# Altium footprint library 3.22-杂项.PcbLib: 985 footprints (part 52 of 64)
Each footprint in its own frame and in the unit in brackets; x right, y up, seen from the top. Pads: shape width x height; smd on the part's side, far side on the other; paste and mask are expansions set on the pad; w line width, h text height; cw(c..) or ccw(c..) is an arc to the next point about the centre after c.
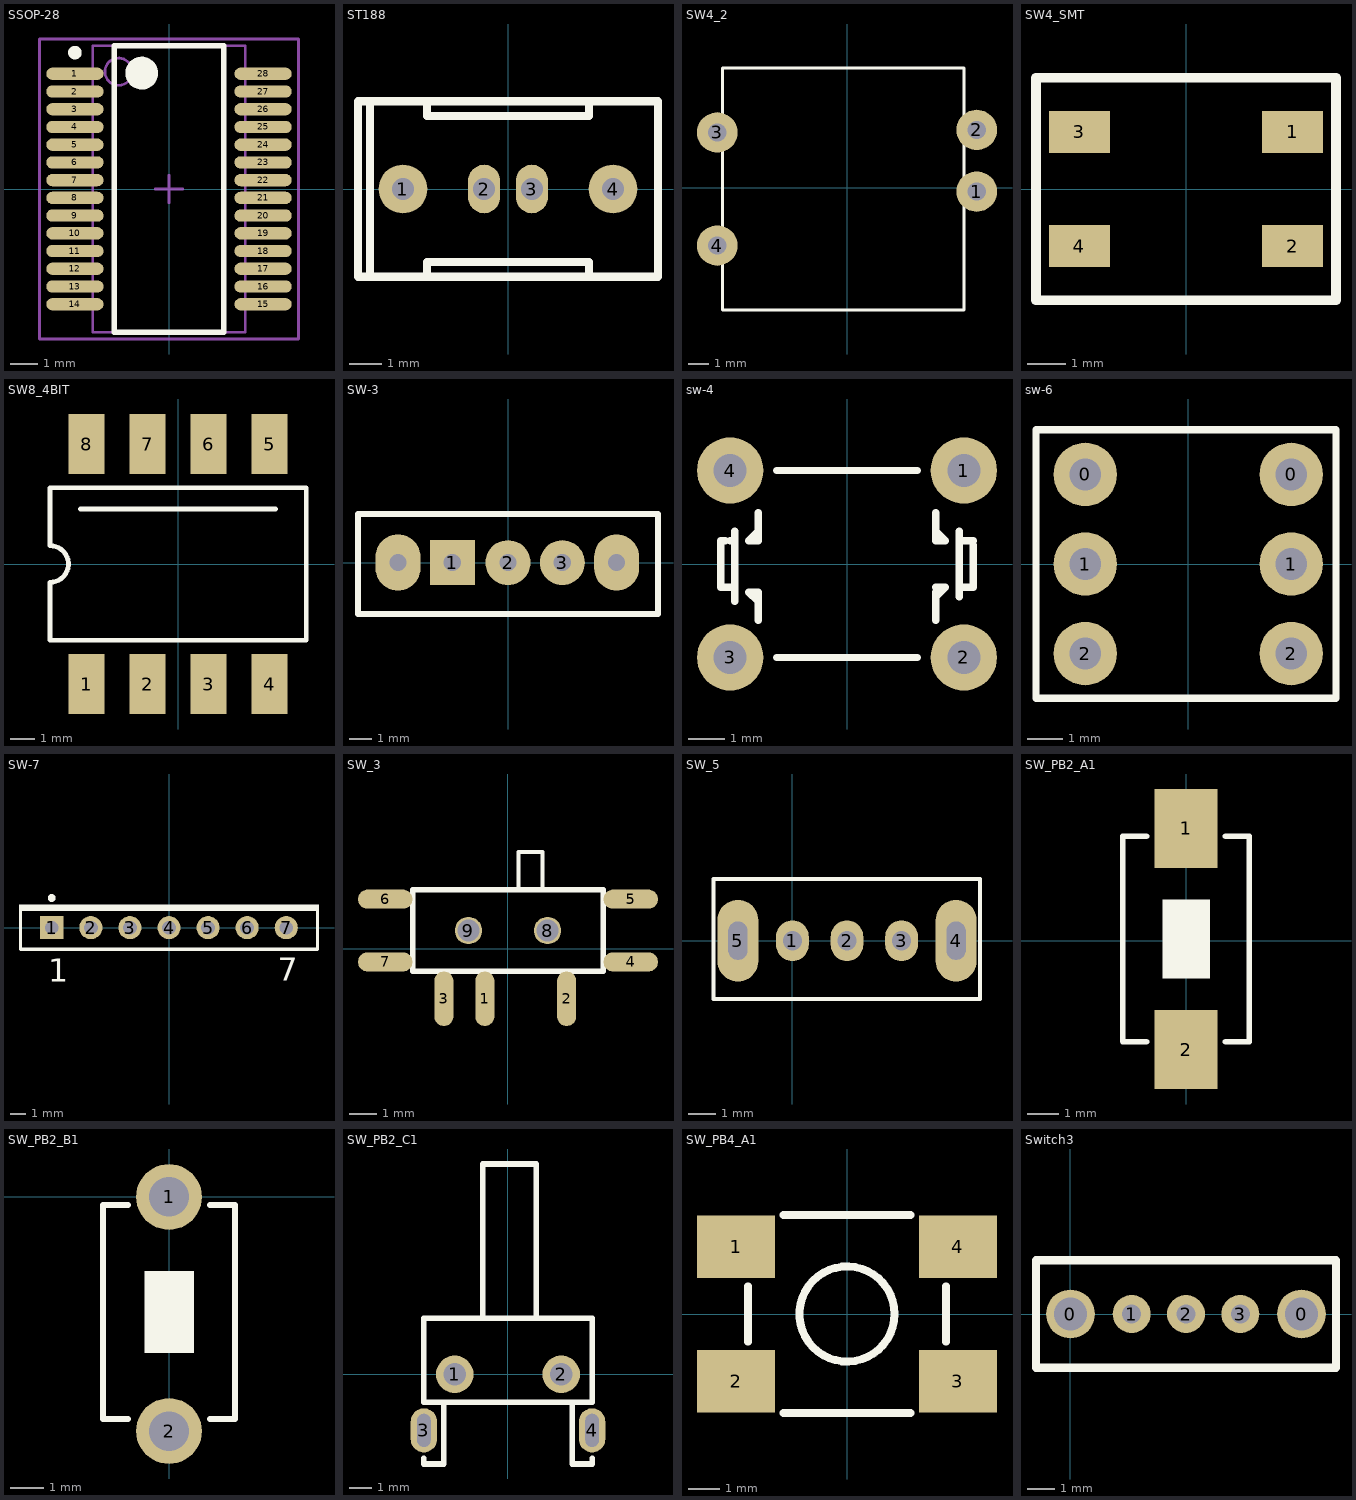
[diagram p51: the footprints below, top view; thin cyan lines are the x and y axes]

## SSOP-28 [mm] "FT232"
height 2
pads (28):
  oval 2.1x0.45 smd: 1(-3.45,4.225) 2(-3.45,3.575) 3(-3.45,2.925) 4(-3.45,2.275) 5(-3.45,1.625) 6(-3.45,0.975) 7(-3.45,0.325) 8(-3.45,-0.325) 9(-3.45,-0.975) 10(-3.45,-1.625) 11(-3.45,-2.275) 12(-3.45,-2.925) 13(-3.45,-3.575) 14(-3.45,-4.225) 15(3.45,-4.225) 16(3.45,-3.575) 17(3.45,-2.925) 18(3.45,-2.275) 19(3.45,-1.625) 20(3.45,-0.975) 21(3.45,-0.325) 22(3.45,0.325) 23(3.45,0.975) 24(3.45,1.625) 25(3.45,2.275) 26(3.45,2.925) 27(3.45,3.575) 28(3.45,4.225)
Top Overlay:
  circle w0.25: c-3.45,5 r0.125
  circle w0.6: c-1,4.25 r0.3
  lines w0.2: -2,-5.25 -2,5.25 2,5.25 2,-5.25 -2,-5.25
Mechanical 13:
  circle w0.1: c-1.85,4.3 r0.5
  lines w0.1: -2.8,-5.25 -2.8,5.25 2.8,5.25 2.8,-5.25 -2.8,-5.25
Mechanical 15:
  lines w0.1: -0.5,0 0.5,0 ; 0,-0.5 0,0.5 ; -4.75,-5.5 -4.75,5.5 4.75,5.5 4.75,-5.5 -4.75,-5.5
3D body: height 2, standoff 0.09, extent -2.8,-5.25 2.8,5.25

## ST188 [mm] "反射式光电传感器"
height 8.2
pads (4):
  round 1.524 hole 0.7: 1(-3.29,0) 4(3.29,0)
  oval 1x1.524 hole 0.7: 2(-0.75,0) 3(0.75,0)
Top Overlay:
  lines w0.254: -4.318,-2.75 -4.318,2.75 ; -2.54,-2.75 -2.54,-2.286 2.54,-2.286 2.54,-2.75 ; -2.54,2.75 -2.54,2.286 2.54,2.286 2.54,2.75 ; -4.7,-2.75 4.7,-2.75 4.7,2.75 -4.7,2.75 -4.7,-2.75

## SW4_2 [mm]
pads (4):
  round 2 hole 0.9: 1(6.413,-0.191) 2(6.413,2.857) 3(-6.413,2.73) 4(-6.413,-2.857)
Top Overlay:
  lines w0.15: -6.159,-6.032 -6.159,5.905 5.779,5.905 5.779,-6.032 -6.159,-6.032

## SW4_SMT [mm]
pads (4):
  rect 1.6x1.1 smd: 1(2.8,1.5) 2(2.8,-1.5) 3(-2.8,1.5) 4(-2.8,-1.5)
Top Overlay:
  lines w0.254: -3.937,-2.921 3.937,-2.921 3.937,2.921 -3.937,2.921 -3.937,-2.921

## SW8_4BIT [mm] "贴片拨码开关"
height 1.75
pads (8):
  rect 1.5x2.5 smd: 1(-3.81,-5) 2(-1.27,-5) 3(1.27,-5) 4(3.81,-5) 5(3.81,5) 6(1.27,5) 7(-1.27,5) 8(-3.81,5)
Top Overlay:
  lines w0.2: -4.064,2.286 4.064,2.286 ; -5.334,-3.175 5.334,-3.175 5.334,3.175 -5.334,3.175 -5.334,0.762 cw(c-5.334,0) -5.334,-0.762 -5.334,-3.175
3D body: height 2.15, standoff 2.05, extent 3.048,0.889 4.572,2.413
3D body: height 2.15, standoff 2.05, extent 0.508,0.889 2.032,2.413
3D body: height 2.15, standoff 2.05, extent -2.032,-2.032 -0.508,-0.508
3D body: height 2.15, standoff 2.05, extent -4.572,0.889 -3.048,2.413
3D body: height 2.05, standoff 2, extent 3.048,-2.032 4.572,2.413
3D body: height 2.05, standoff 2, extent 0.508,-2.032 2.032,2.413
3D body: height 2.05, standoff 2, extent -2.032,-2.032 -0.508,2.413
3D body: height 2.05, standoff 2, extent -4.572,-2.032 -3.048,2.413
3D body: height 2, standoff 0, extent -5.207,-3.429 5.08,3.429

## SW-3 [mm]
pads (5):
  rect 2x2 hole 0.762: 1(-2.476,0)
  round 2 hole 0.762: 2(0,0) 3(2.413,0)
  oval 2x2.5 hole 0.762: ""(-4.889,0) ""(4.826,0)
Top Overlay:
  lines w0.254: -6.667,-2.286 -6.667,2.159 6.667,2.159 6.667,-2.286 -6.667,-2.286

## sw-4 [mm]
pads (4):
  round 1.8 hole 0.9: 1(3.175,2.54) 2(3.175,-2.54) 3(-3.175,-2.54) 4(-3.175,2.54)
Top Overlay:
  lines w0.203: -3.302,0.635 -3.429,0.635 -3.429,-0.635 -3.048,-0.635 ; -3.175,0.635 -3.048,0.635 ; -3.048,-1.016 -3.048,0.889 ; -2.413,-1.524 -2.413,-0.762 -2.667,-0.762 -2.413,-1.016 ; -2.413,0.889 -2.667,0.635 -2.413,0.635 -2.413,1.397 ; -1.905,-2.54 1.905,-2.54 ; -1.905,2.54 1.905,2.54 ; 2.413,-1.524 2.413,-0.762 ; 2.413,-0.889 2.667,-0.635 2.413,-0.635 ; 2.413,0.889 2.667,0.635 2.413,0.635 2.413,1.397 ; 3.048,-0.889 3.048,0.889 ; 3.048,-0.635 3.429,-0.635 3.429,0.508 ; 3.175,0.635 3.429,0.635

## sw-6 [mm]
pads (6):
  round 1.8 hole 0.9: 0(-2.921,2.54) 0(2.921,2.54) 1(-2.921,0) 1(2.921,0) 2(-2.921,-2.54) 2(2.921,-2.54)
Top Overlay:
  lines w0.203: -4.318,-3.81 4.191,-3.81 4.191,3.81 -4.318,3.81 -4.318,-3.81

## SW-7 [mm] "6 Way Switch; 7 Leads"
pads (7):
  rect 1.5x1.5 hole 0.9: 1(-7.62,0)
  round 1.5 hole 0.9: 2(-5.08,0) 3(-2.54,0) 4(0,0) 5(2.54,0) 6(5.08,0) 7(7.62,0)
Top Overlay:
  circle w0.25: c-7.625,1.929 r0.125
  rectangle: -9.75,1.1 9.75,1.5
  lines w0.2: -9.65,1.4 -9.65,-1.4 9.65,-1.4 9.65,1.4
  text "7" at 7.084,-3.445 h1.5
  text "1" at -7.851,-3.526 h1.5

## SW_3 [mm]
pads (9):
  oval 0.7x2 smd: 1(-0.85,-1.825) 2(2.15,-1.825) 3(-2.35,-1.825)
  oval 2x0.7 smd: 4(4.5,-0.475) 5(4.5,1.825) 6(-4.5,1.825) 7(-4.5,-0.475)
  round 1 hole 0.8: 8(1.45,0.675) 9(-1.45,0.675)
Top Overlay:
  lines w0.15: 0.381,2.175 0.381,3.556 1.27,3.556 1.27,2.175
  lines w0.2: -3.5,-0.825 3.5,-0.825 3.5,2.175 -3.5,2.175 -3.5,-0.825

## SW_5 [mm]
pads (5):
  oval 1.2x1.5 hole 0.7: 1(0,0) 2(2,0) 3(4,0)
  oval 1.5x3 hole 0.7 slot 1.4 at 90 deg: 4(6,0) 5(-2,0)
Top Overlay:
  lines w0.15: -2.896,-2.134 6.883,-2.134 6.883,2.261 -2.896,2.261 -2.896,-2.134

## SW_PB2_A1 [mm]
pads (2):
  rect 2x2.5 smd: 1(0,3.556) 2(0,-3.444)
Top Overlay:
  region: -0.747,1.309 -0.747,-1.191 0.753,-1.191 0.753,1.309
  lines w0.178: -1.25,-3.194 -2,-3.19 -2,3.306 -1.25,3.306 ; 1.25,-3.194 2,-3.194 2,3.306 1.25,3.306
3D body: height 1.2, standoff 0.8, extent -0.762,-1.143 0.762,1.27
3D body: height 0.8, standoff 0, extent -2.032,-3.175 2.032,3.302

## SW_PB2_B1 [mm]
pads (2):
  round 2 hole 1.2: 1(0,0) 2(0,-7.112)
Top Overlay:
  region: -0.747,-2.247 -0.747,-4.747 0.753,-4.747 0.753,-2.247
  lines w0.178: -1.25,-6.75 -2,-6.746 -2,-0.25 -1.25,-0.25 ; 1.25,-6.75 2,-6.75 2,-0.25 1.25,-0.25

## SW_PB2_C1 [mm] "侧卧微动开关"
height 8
pads (4):
  round 1.7 hole 1: 1(-2.413,0) 2(2.413,0)
  oval 1.2x2 hole 0.6 slot 1.5 at 90 deg: 3(-3.81,-2.54) 4(3.81,-2.54)
Top Overlay:
  lines w0.25: -3.81,-3.81 -3.81,-4.064 -2.921,-4.064 -2.921,-1.27 ; -1.143,2.54 -1.143,9.525 1.27,9.525 1.27,2.54 ; 2.921,-1.27 2.921,-4.064 3.81,-4.064 3.81,-3.81 ; -3.81,-1.27 -3.81,2.54 3.81,2.54 3.81,-1.27 -3.81,-1.27

## SW_PB4_A1 [mil]
pads (4):
  rect 98.42x78.74 smd: 1(-140,85) 2(-140,-85) 3(140,-85) 4(140,85)
Top Overlay:
  circle w10: c0,0 r60
  lines w9.84: -125,-35 -125,35 ; -80,-125 80,-125 ; -80,125 80,125 ; 125,-35 125,35
3D body: height 59.06, standoff 0, extent -125,-125 125,125
3D body: height 236.22, standoff 0, extent -60,-60 60,60

## Switch3 [mm]
pads (5):
  round 1.8 hole 1.2: 0(0,0) 0(8.508,0)
  round 1.4 hole 0.7: 1(2.254,0) 2(4.254,0) 3(6.254,0)
Top Overlay:
  lines w0.305: -1.27,-1.981 -1.27,1.981 9.778,1.981 9.778,-1.981 -1.27,-1.981